# Altium footprint library con-samtec.PCBLIB: 805 footprints (part 28 of 55)
Each footprint in its own frame and in the unit in brackets; x right, y up, seen from the top. Pads: shape width x height; smd on the part's side, far side on the other; paste and mask are expansions set on the pad; w line width, h text height; cw(c..) or ccw(c..) is an arc to the next point about the centre after c.
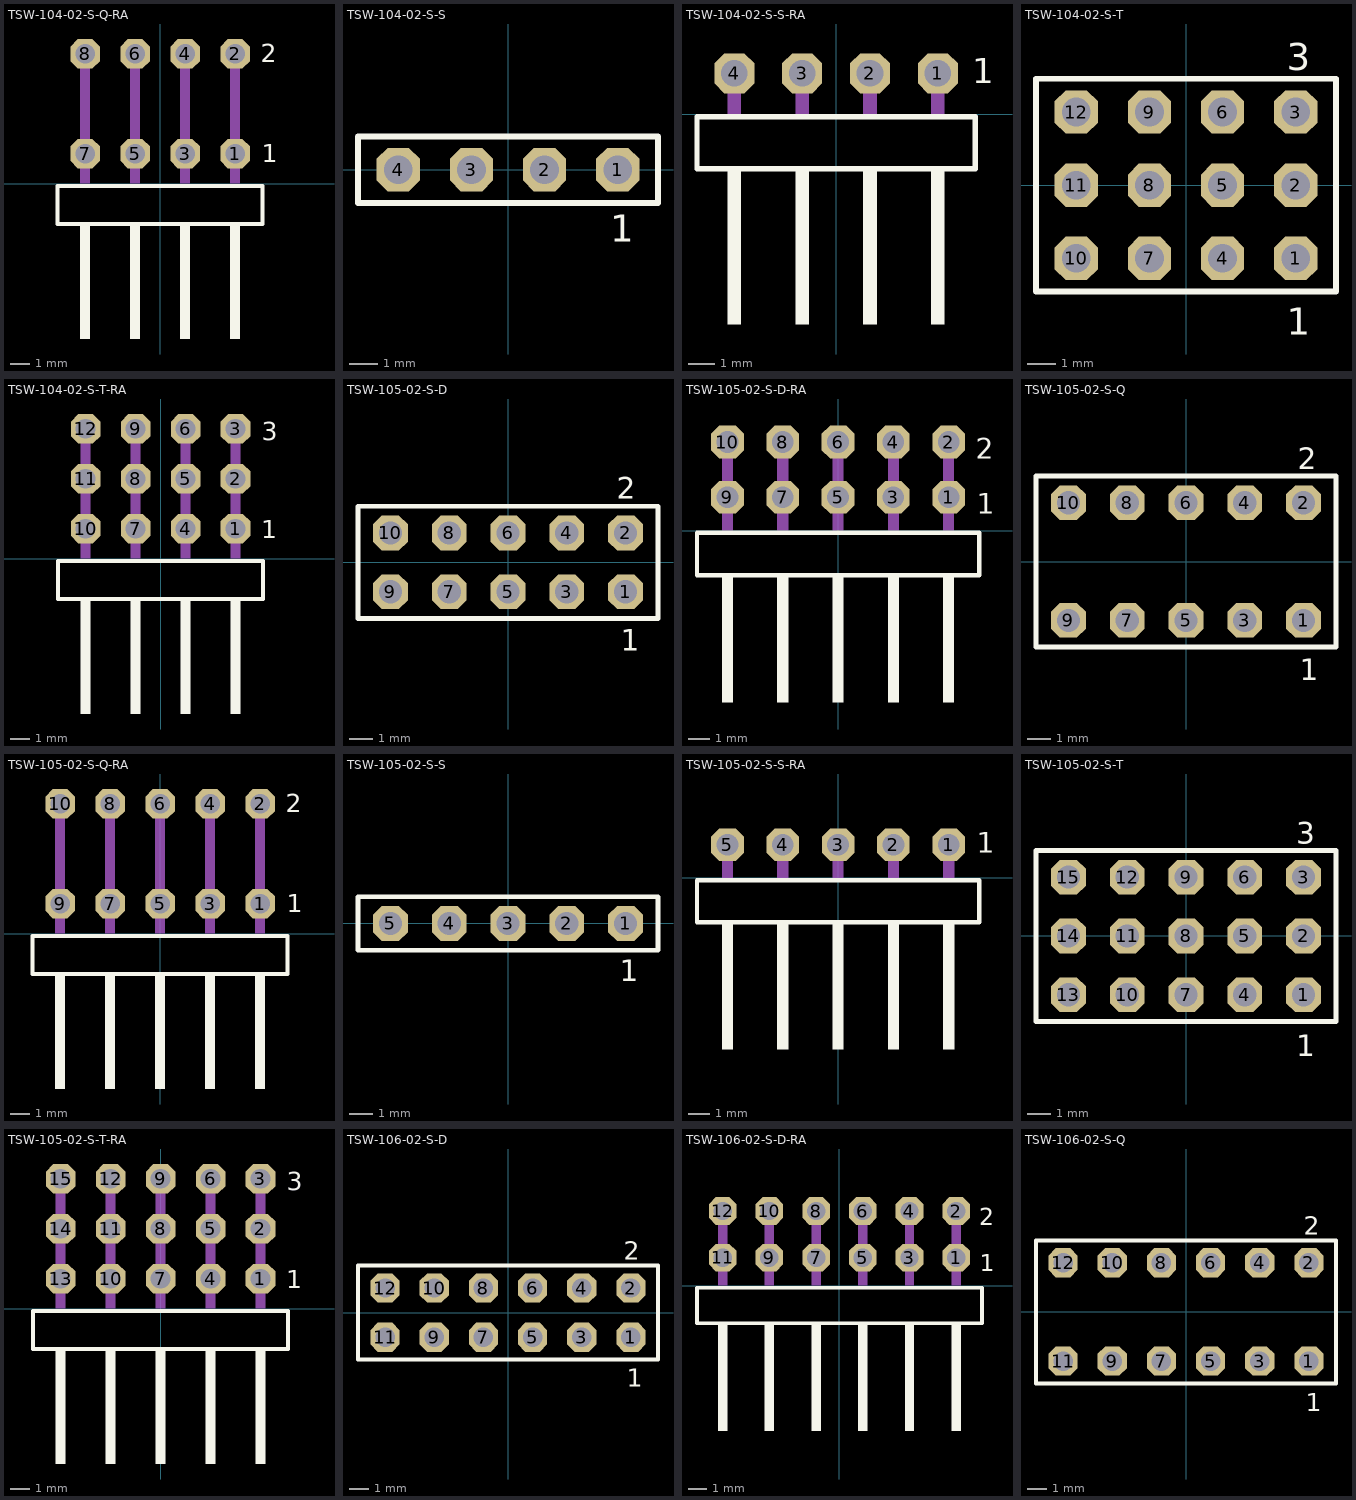
[diagram p27: the footprints below, top view; thin cyan lines are the x and y axes]

## TSW-104-02-S-Q-RA [mil]
pads (8):
  oct 59.06x59.06 hole 39.37: 1(150,60) 2(150,260) 3(50,60) 4(50,260) 5(-50,60) 6(-50,260) 7(-150,60) 8(-150,260)
Top Overlay:
  rectangle: -160,-310.63 -140,-80.32
  rectangle: -60,-310.63 -40,-80.32
  rectangle: 40,-310.63 60,-80.32
  rectangle: 140,-310.63 160,-80.32
  lines w8: -205.08,-80.55 205.08,-80.55 205.08,-4.17 -205.08,-4.17 -205.08,-80.55
  text "1" at 203.54,43.31 h36.81
  text "2" at 201.18,242.72 h36.81
Mechanical 16:
  rectangle: -160,0 -140,270
  rectangle: -60,0 -40,270
  rectangle: 40,0 60,270
  rectangle: 140,0 160,270

## TSW-104-02-S-S [mm]
pads (4):
  oct 1.5x1.5 hole 1: 1(3.81,0) 2(1.27,0) 3(-1.27,0) 4(-3.81,0)
Top Overlay:
  lines w0.203: -5.209,-1.155 5.209,-1.155 5.209,1.155 -5.209,1.155 -5.209,-1.155
  text "1" at 3.552,-2.498 h0.94
Mechanical 16:
  rectangle: -4.16,-0.35 -3.46,0.35
  rectangle: -1.62,-0.35 -0.92,0.35
  rectangle: 0.92,-0.35 1.62,0.35
  rectangle: 3.46,-0.35 4.16,0.35

## TSW-104-02-S-S-RA [mil]
pads (4):
  oct 59.06x59.06 hole 39.37: 1(150,60) 2(50,60) 3(-50,60) 4(-150,60)
Top Overlay:
  rectangle: -160,-310.63 -140,-80.32
  rectangle: -60,-310.63 -40,-80.32
  rectangle: 40,-310.63 60,-80.32
  rectangle: 140,-310.63 160,-80.32
  lines w8: -205.08,-80.55 205.08,-80.55 205.08,-4.17 -205.08,-4.17 -205.08,-80.55
  text "1" at 200.47,45.35 h36.81
Mechanical 16:
  rectangle: -160,0 -140,70
  rectangle: -60,0 -40,70
  rectangle: 40,0 60,70
  rectangle: 140,0 160,70

## TSW-104-02-S-T [mm]
pads (12):
  oct 1.5x1.5 hole 1: 1(3.81,-2.54) 2(3.81,0) 3(3.81,2.54) 4(1.27,-2.54) 5(1.27,0) 6(1.27,2.54) 7(-1.27,-2.54) 8(-1.27,0) 9(-1.27,2.54) 10(-3.81,-2.54) 11(-3.81,0) 12(-3.81,2.54)
Top Overlay:
  lines w0.203: -5.209,-3.695 5.209,-3.695 5.209,3.695 -5.209,3.695 -5.209,-3.695
  text "1" at 3.502,-5.188 h0.94
  text "3" at 3.498,3.989 h0.94
Mechanical 16:
  rectangle: -4.16,-2.89 -3.46,-2.19
  rectangle: -4.16,-0.35 -3.46,0.35
  rectangle: -4.16,2.19 -3.46,2.89
  rectangle: -1.62,-2.89 -0.92,-2.19
  rectangle: -1.62,-0.35 -0.92,0.35
  rectangle: -1.62,2.19 -0.92,2.89
  rectangle: 0.92,-2.89 1.62,-2.19
  rectangle: 0.92,-0.35 1.62,0.35
  rectangle: 0.92,2.19 1.62,2.89
  rectangle: 3.46,-2.89 4.16,-2.19
  rectangle: 3.46,-0.35 4.16,0.35
  rectangle: 3.46,2.19 4.16,2.89

## TSW-104-02-S-T-RA [mil]
pads (12):
  oct 59.06x59.06 hole 39.37: 1(150,60) 2(150,160) 3(150,260) 4(50,60) 5(50,160) 6(50,260) 7(-50,60) 8(-50,160) 9(-50,260) 10(-150,60) 11(-150,160) 12(-150,260)
Top Overlay:
  rectangle: -160,-310.63 -140,-80.32
  rectangle: -60,-310.63 -40,-80.32
  rectangle: 40,-310.63 60,-80.32
  rectangle: 140,-310.63 160,-80.32
  lines w8: -205.08,-80.55 205.08,-80.55 205.08,-4.17 -205.08,-4.17 -205.08,-80.55
  text "1" at 201.57,41.34 h36.81
  text "3" at 202.17,236.81 h36.81
Mechanical 16:
  rectangle: -160,0 -140,270
  rectangle: -60,0 -40,270
  rectangle: 40,0 60,270
  rectangle: 140,0 160,270

## TSW-105-02-S-D [mm]
pads (10):
  oct 1.5x1.5 hole 1: 1(5.08,-1.27) 2(5.08,1.27) 3(2.54,-1.27) 4(2.54,1.27) 5(0,-1.27) 6(0,1.27) 7(-2.54,-1.27) 8(-2.54,1.27) 9(-5.08,-1.27) 10(-5.08,1.27)
Top Overlay:
  lines w0.203: -6.479,-2.425 6.479,-2.425 6.479,2.425 -6.479,2.425 -6.479,-2.425
  text "1" at 4.872,-3.818 h0.94
  text "2" at 4.697,2.744 h0.94
Mechanical 16:
  rectangle: -5.43,-1.62 -4.73,-0.92
  rectangle: -5.43,0.92 -4.73,1.62
  rectangle: -2.89,-1.62 -2.19,-0.92
  rectangle: -2.89,0.92 -2.19,1.62
  rectangle: -0.35,-1.62 0.35,-0.92
  rectangle: -0.35,0.92 0.35,1.62
  rectangle: 2.19,-1.62 2.89,-0.92
  rectangle: 2.19,0.92 2.89,1.62
  rectangle: 4.73,-1.62 5.43,-0.92
  rectangle: 4.73,0.92 5.43,1.62

## TSW-105-02-S-D-RA [mil]
pads (10):
  oct 59.06x59.06 hole 39.37: 1(200,60) 2(200,160) 3(100,60) 4(100,160) 5(0,60) 6(0,160) 7(-100,60) 8(-100,160) 9(-200,60) 10(-200,160)
Top Overlay:
  rectangle: -210,-310.63 -190,-80.32
  rectangle: -110,-310.63 -90,-80.32
  rectangle: -10,-310.63 10,-80.32
  rectangle: 90,-310.63 110,-80.32
  rectangle: 190,-310.63 210,-80.32
  lines w8: -255.08,-80.55 255.08,-80.55 255.08,-4.17 -255.08,-4.17 -255.08,-80.55
  text "1" at 250.59,30.51 h36.81
  text "2" at 249.21,129.53 h36.81
Mechanical 16:
  rectangle: -210,0 -190,170
  rectangle: -110,0 -90,170
  rectangle: -10,0 10,170
  rectangle: 90,0 110,170
  rectangle: 190,0 210,170

## TSW-105-02-S-Q [mm]
pads (10):
  oct 1.5x1.5 hole 1: 1(5.08,-2.54) 2(5.08,2.54) 3(2.54,-2.54) 4(2.54,2.54) 5(0,-2.54) 6(0,2.54) 7(-2.54,-2.54) 8(-2.54,2.54) 9(-5.08,-2.54) 10(-5.08,2.54)
Top Overlay:
  lines w0.203: -6.479,-3.695 6.479,-3.695 6.479,3.695 -6.479,3.695 -6.479,-3.695
  text "1" at 4.922,-5.138 h0.94
  text "2" at 4.822,3.989 h0.94
Mechanical 16:
  rectangle: -5.43,-2.89 -4.73,-2.19
  rectangle: -5.43,2.19 -4.73,2.89
  rectangle: -2.89,-2.89 -2.19,-2.19
  rectangle: -2.89,2.19 -2.19,2.89
  rectangle: -0.35,-2.89 0.35,-2.19
  rectangle: -0.35,2.19 0.35,2.89
  rectangle: 2.19,-2.89 2.89,-2.19
  rectangle: 2.19,2.19 2.89,2.89
  rectangle: 4.73,-2.89 5.43,-2.19
  rectangle: 4.73,2.19 5.43,2.89

## TSW-105-02-S-Q-RA [mil]
pads (10):
  oct 59.06x59.06 hole 39.37: 1(200,60) 2(200,260) 3(100,60) 4(100,260) 5(0,60) 6(0,260) 7(-100,60) 8(-100,260) 9(-200,60) 10(-200,260)
Top Overlay:
  rectangle: -210,-310.63 -190,-80.32
  rectangle: -110,-310.63 -90,-80.32
  rectangle: -10,-310.63 10,-80.32
  rectangle: 90,-310.63 110,-80.32
  rectangle: 190,-310.63 210,-80.32
  lines w8: -255.08,-80.55 255.08,-80.55 255.08,-4.17 -255.08,-4.17 -255.08,-80.55
  text "1" at 253.54,43.31 h36.81
  text "2" at 251.18,242.72 h36.81
Mechanical 16:
  rectangle: -210,0 -190,270
  rectangle: -110,0 -90,270
  rectangle: -10,0 10,270
  rectangle: 90,0 110,270
  rectangle: 190,0 210,270

## TSW-105-02-S-S [mm]
pads (5):
  oct 1.5x1.5 hole 1: 1(5.08,0) 2(2.54,0) 3(0,0) 4(-2.54,0) 5(-5.08,0)
Top Overlay:
  lines w0.203: -6.479,-1.155 6.479,-1.155 6.479,1.155 -6.479,1.155 -6.479,-1.155
  text "1" at 4.822,-2.498 h0.94
Mechanical 16:
  rectangle: -5.43,-0.35 -4.73,0.35
  rectangle: -2.89,-0.35 -2.19,0.35
  rectangle: -0.35,-0.35 0.35,0.35
  rectangle: 2.19,-0.35 2.89,0.35
  rectangle: 4.73,-0.35 5.43,0.35

## TSW-105-02-S-S-RA [mil]
pads (5):
  oct 59.06x59.06 hole 39.37: 1(200,60) 2(100,60) 3(0,60) 4(-100,60) 5(-200,60)
Top Overlay:
  rectangle: -210,-310.63 -190,-80.32
  rectangle: -110,-310.63 -90,-80.32
  rectangle: -10,-310.63 10,-80.32
  rectangle: 90,-310.63 110,-80.32
  rectangle: 190,-310.63 210,-80.32
  lines w8: -255.08,-80.55 255.08,-80.55 255.08,-4.17 -255.08,-4.17 -255.08,-80.55
  text "1" at 250.47,45.35 h36.81
Mechanical 16:
  rectangle: -210,0 -190,70
  rectangle: -110,0 -90,70
  rectangle: -10,0 10,70
  rectangle: 90,0 110,70
  rectangle: 190,0 210,70

## TSW-105-02-S-T [mm]
pads (15):
  oct 1.5x1.5 hole 1: 1(5.08,-2.54) 2(5.08,0) 3(5.08,2.54) 4(2.54,-2.54) 5(2.54,0) 6(2.54,2.54) 7(0,-2.54) 8(0,0) 9(0,2.54) 10(-2.54,-2.54) 11(-2.54,0) 12(-2.54,2.54) 13(-5.08,-2.54) 14(-5.08,0) 15(-5.08,2.54)
Top Overlay:
  lines w0.203: -6.479,-3.695 6.479,-3.695 6.479,3.695 -6.479,3.695 -6.479,-3.695
  text "1" at 4.772,-5.188 h0.94
  text "3" at 4.768,3.989 h0.94
Mechanical 16:
  rectangle: -5.43,-2.89 -4.73,-2.19
  rectangle: -5.43,-0.35 -4.73,0.35
  rectangle: -5.43,2.19 -4.73,2.89
  rectangle: -2.89,-2.89 -2.19,-2.19
  rectangle: -2.89,-0.35 -2.19,0.35
  rectangle: -2.89,2.19 -2.19,2.89
  rectangle: -0.35,-2.89 0.35,-2.19
  rectangle: -0.35,-0.35 0.35,0.35
  rectangle: -0.35,2.19 0.35,2.89
  rectangle: 2.19,-2.89 2.89,-2.19
  rectangle: 2.19,-0.35 2.89,0.35
  rectangle: 2.19,2.19 2.89,2.89
  rectangle: 4.73,-2.89 5.43,-2.19
  rectangle: 4.73,-0.35 5.43,0.35
  rectangle: 4.73,2.19 5.43,2.89

## TSW-105-02-S-T-RA [mil]
pads (15):
  oct 59.06x59.06 hole 39.37: 1(200,60) 2(200,160) 3(200,260) 4(100,60) 5(100,160) 6(100,260) 7(0,60) 8(0,160) 9(0,260) 10(-100,60) 11(-100,160) 12(-100,260) 13(-200,60) 14(-200,160) 15(-200,260)
Top Overlay:
  rectangle: -210,-310.63 -190,-80.32
  rectangle: -110,-310.63 -90,-80.32
  rectangle: -10,-310.63 10,-80.32
  rectangle: 90,-310.63 110,-80.32
  rectangle: 190,-310.63 210,-80.32
  lines w8: -255.08,-80.55 255.08,-80.55 255.08,-4.17 -255.08,-4.17 -255.08,-80.55
  text "1" at 251.57,41.34 h36.81
  text "3" at 252.17,236.81 h36.81
Mechanical 16:
  rectangle: -210,0 -190,270
  rectangle: -110,0 -90,270
  rectangle: -10,0 10,270
  rectangle: 90,0 110,270
  rectangle: 190,0 210,270

## TSW-106-02-S-D [mm]
pads (12):
  oct 1.5x1.5 hole 1: 1(6.35,-1.27) 2(6.35,1.27) 3(3.81,-1.27) 4(3.81,1.27) 5(1.27,-1.27) 6(1.27,1.27) 7(-1.27,-1.27) 8(-1.27,1.27) 9(-3.81,-1.27) 10(-3.81,1.27) 11(-6.35,-1.27) 12(-6.35,1.27)
Top Overlay:
  lines w0.203: -7.749,-2.425 7.749,-2.425 7.749,2.425 -7.749,2.425 -7.749,-2.425
  text "1" at 6.142,-3.818 h0.94
  text "2" at 5.967,2.744 h0.94
Mechanical 16:
  rectangle: -6.7,-1.62 -6,-0.92
  rectangle: -6.7,0.92 -6,1.62
  rectangle: -4.16,-1.62 -3.46,-0.92
  rectangle: -4.16,0.92 -3.46,1.62
  rectangle: -1.62,-1.62 -0.92,-0.92
  rectangle: -1.62,0.92 -0.92,1.62
  rectangle: 0.92,-1.62 1.62,-0.92
  rectangle: 0.92,0.92 1.62,1.62
  rectangle: 3.46,-1.62 4.16,-0.92
  rectangle: 3.46,0.92 4.16,1.62
  rectangle: 6,-1.62 6.7,-0.92
  rectangle: 6,0.92 6.7,1.62

## TSW-106-02-S-D-RA [mil]
pads (12):
  oct 59.06x59.06 hole 39.37: 1(250,60) 2(250,160) 3(150,60) 4(150,160) 5(50,60) 6(50,160) 7(-50,60) 8(-50,160) 9(-150,60) 10(-150,160) 11(-250,60) 12(-250,160)
Top Overlay:
  rectangle: -260,-310.63 -240,-80.32
  rectangle: -160,-310.63 -140,-80.32
  rectangle: -60,-310.63 -40,-80.32
  rectangle: 40,-310.63 60,-80.32
  rectangle: 140,-310.63 160,-80.32
  rectangle: 240,-310.63 260,-80.32
  lines w8: -305.08,-80.55 305.08,-80.55 305.08,-4.17 -305.08,-4.17 -305.08,-80.55
  text "1" at 300.59,30.51 h36.81
  text "2" at 299.21,129.53 h36.81
Mechanical 16:
  rectangle: -260,0 -240,170
  rectangle: -160,0 -140,170
  rectangle: -60,0 -40,170
  rectangle: 40,0 60,170
  rectangle: 140,0 160,170
  rectangle: 240,0 260,170

## TSW-106-02-S-Q [mm]
pads (12):
  oct 1.5x1.5 hole 1: 1(6.35,-2.54) 2(6.35,2.54) 3(3.81,-2.54) 4(3.81,2.54) 5(1.27,-2.54) 6(1.27,2.54) 7(-1.27,-2.54) 8(-1.27,2.54) 9(-3.81,-2.54) 10(-3.81,2.54) 11(-6.35,-2.54) 12(-6.35,2.54)
Top Overlay:
  lines w0.203: -7.749,-3.695 7.749,-3.695 7.749,3.695 -7.749,3.695 -7.749,-3.695
  text "1" at 6.192,-5.138 h0.94
  text "2" at 6.092,3.989 h0.94
Mechanical 16:
  rectangle: -6.7,-2.89 -6,-2.19
  rectangle: -6.7,2.19 -6,2.89
  rectangle: -4.16,-2.89 -3.46,-2.19
  rectangle: -4.16,2.19 -3.46,2.89
  rectangle: -1.62,-2.89 -0.92,-2.19
  rectangle: -1.62,2.19 -0.92,2.89
  rectangle: 0.92,-2.89 1.62,-2.19
  rectangle: 0.92,2.19 1.62,2.89
  rectangle: 3.46,-2.89 4.16,-2.19
  rectangle: 3.46,2.19 4.16,2.89
  rectangle: 6,-2.89 6.7,-2.19
  rectangle: 6,2.19 6.7,2.89